# Altium schematic symbol library altera.SCHLIB: 68 symbols (part 5 of 6) (continued)
## EPM7096-J84
designator IC?, comment EPM7096   MAX 7000 family
MPN: EPM7096LC84-10; OC_FARNELL: unknown; OC_NEWARK: 51R9659
footprint PLCC84
part A pins: 1 GCLR/, 2 OE2-GCLK2, 4 IO16, 5 IO14, 8 IO12, 9 IO11, 10 IO9, 11 IO8, 12 IO6, 14 IO4, 15 IO3, 16 IO1, 17 IO32, 18 IO29, 20 IO28, 21 IO27, 22 IO25, 23 IO24, 24 IO22, 25 IO21, 27 IO19, 28 IO17, 29 IO48, 30 IO46, 31 IO45, 33 IO43, 34 IO41, 35 IO40, 36 IO38, 37 IO37, 40 IO35, 41 IO33, 44 IO49, 45 IO51, 48 IO53, 49 IO54, 50 IO56, 51 IO57, 52 IO59, 54 IO61, 55 IO62, 56 IO64, 57 IO65, 58 IO67, 60 IO69, 61 IO70, 62 IO72, 63 IO73, 64 IO75, 65 IO76, 67 IO77, 68 IO80, 69 IO81, 70 IO83, 71 IO84, 73 IO86, 74 IO88, 75 IO89, 76 IO91, 77 IO92, 80 IO94, 81 IO96, 83 GCLK1, 84 OE1
part B pins: 3 VCC (power), 7 GND (power), 13 VCCIO (power), 19 GND@1 (power), 26 VCCIO@1 (power), 32 GND@2 (power), 38 VCCIO@2 (power), 42 GND@3 (power), 43 VCC@1 (power), 47 GND@4 (power), 53 VCCIO@3 (power), 59 GND@5 (power), 66 VCCIO@4 (power), 72 GND@6 (power), 78 VCCIO@5 (power), 82 GND@7 (power)
part C pins: 6 NC
part D pins: 39 NC
part E pins: 46 NC
part F pins: 79 NC

## EPM7096-P100
designator IC?, comment EPM7096   MAX 7000 family
MPN: EPM7096QC100-10; OC_FARNELL: unknown; OC_NEWARK: 51R9665
footprint PQFP100
part A pins: 5 VCCIO (power), 13 GND (power), 20 VCCIO@1 (power), 28 GND@1 (power), 36 VCCIO@2 (power), 40 GND@2 (power), 41 VCC (power), 45 GND@3 (power), 53 VCCIO@3 (power), 61 GND@4 (power), 68 VCCIO@4 (power), 76 GND@5 (power), 84 VCCIO@5 (power), 88 GND@6 (power), 93 VCC@1 (power), 97 GND@7 (power)
part B pins: 9 NC
part C pins: 24 NC
part D pins: 37 NC
part E pins: 44 NC
part F pins: 57 NC
part G pins: 72 NC
part H pins: 85 NC
part I pins: 96 NC
part J pins: 1 IO9, 2 IO8, 3 IO6, 4 IO5, 6 IO4, 7 IO3, 8 IO1, 10 IO32, 11 IO30, 12 IO29, 14 IO28, 15 IO27, 16 IO25, 17 IO24, 18 IO22, 19 IO21, 21 IO20, 22 IO19, 23 IO17, 25 IO48, 26 IO46, 27 IO45, 29 IO44, 30 IO43, 31 IO41, 32 IO40, 33 IO38, 34 IO37, 35 IO36, 38 IO35, 39 IO33, 42 IO49, 43 IO51, 46 IO52, 47 IO53, 48 IO54, 49 IO56, 50 IO57, 51 IO59, 52 IO60, 54 IO61, 55 IO62, 56 IO64, 58 IO65, 59 IO67, 60 IO68, 62 IO69, 63 IO70, 64 IO72, 65 IO73, 66 IO75, 67 IO76, 69 IO77, 70 IO78, 71 IO80, 73 IO81, 74 IO83, 75 IO84, 77 IO85, 78 IO86, 79 IO88, 80 IO89, 81 IO91, 82 IO92, 83 IO93, 86 IO94, 87 IO96, 89 GCLK1, 90 OE1, 91 GCLR/, 92 OE2-GCLK2, 94 IO16, 95 IO14, 98 IO13, 99 IO12, 100 IO11

## EPM7128-?100P
designator IC?, comment EPM70128   MAX 7000 family
MPN: EPM7128SQC100-7N; OC_FARNELL: 1549424; OC_NEWARK: 51R0530
footprint PQFP100
part A pins: 1 IO6, 2 IO5, 3 IO3, 4 IO1, 6 IO32/TDI, 7 IO30, 8 IO29, 9 IO27, 10 IO25, 11 IO24, 12 IO22, 14 IO21, 15 IO19, 16 IO17, 17 IO48/TMS, 18 IO46, 19 IO45, 21 IO43, 22 IO41, 23 IO40, 24 IO38, 25 IO37, 26 IO35, 27 IO33, 29 IO64, 30 IO62, 31 IO61, 32 IO59, 33 IO57, 34 IO56, 35 IO54, 37 IO53, 38 IO51, 39 IO49, 42 IO65, 43 IO67, 44 IO69, 46 IO70, 47 IO72, 48 IO73, 49 IO75, 50 IO77, 51 IO78, 52 IO80, 54 IO81, 55 IO83, 56 IO85, 57 IO86, 58 IO88, 59 IO89, 60 IO91, 62 IO93, 63 IO94, 64 TCM/IO96, 65 IO97, 66 IO99, 67 IO101, 69 IO102, 70 IO104, 71 IO105, 72 IO107, 73 IO109, 74 IO110, 75 TDO/IO112, 77 IO113, 78 IO115, 79 IO117, 80 IO118, 81 IO120, 82 IO121, 83 IO123, 85 IO125, 86 IO126, 87 IO128, 89 GCLK1, 90 OE1, 91 GCLR/, 92 OE2-GCLK2, 94 IO16, 95 IO14, 96 IO13, 98 IO11, 99 IO9, 100 IO8
part B pins: 41 VCC (power)
part C pins: 93 VCC (power)
part D pins: 5 VCCIO (power)
part E pins: 20 VCCIO (power)
part F pins: 36 VCCIO (power)
part G pins: 53 VCCIO (power)
part H pins: 68 VCCIO (power)
part I pins: 84 VCCIO (power)
part J pins: 13 GND (power)
part K pins: 28 GND (power)
part L pins: 45 GND (power)
part M pins: 61 GND (power)
part N pins: 76 GND (power)
part O pins: 97 GND (power)
part P pins: 40 GND (power)
part Q pins: 88 GND (power)

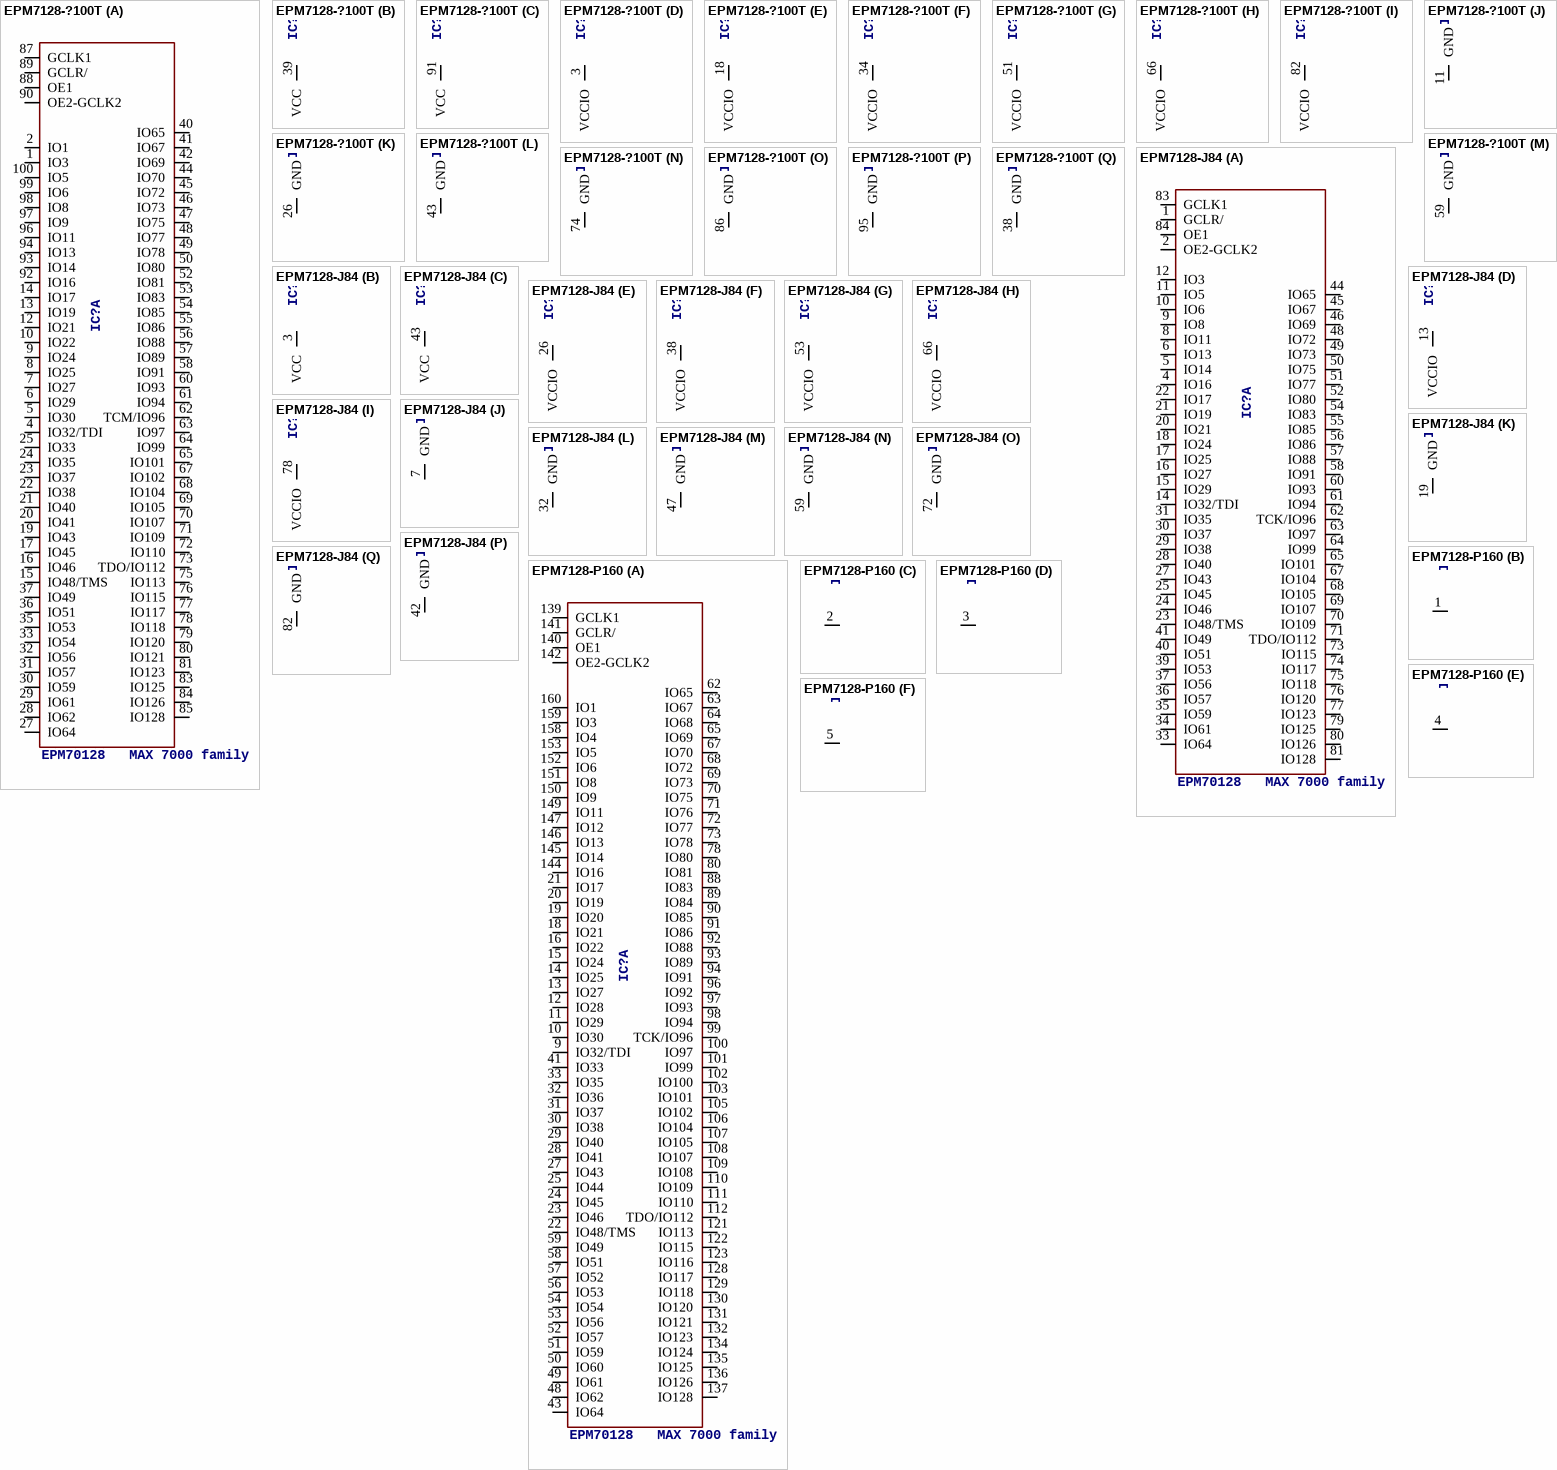
[diagram p43: symbols EPM7128-?100T to EPM7128-P160]

## EPM7128-?100T
designator IC?, comment EPM70128   MAX 7000 family
MPN: EPM7128STC100-7N; OC_FARNELL: 1549427; OC_NEWARK: 51R9778
footprint TQFP100
part A pins: 1 IO3, 2 IO1, 4 IO32/TDI, 5 IO30, 6 IO29, 7 IO27, 8 IO25, 9 IO24, 10 IO22, 12 IO21, 13 IO19, 14 IO17, 15 IO48/TMS, 16 IO46, 17 IO45, 19 IO43, 20 IO41, 21 IO40, 22 IO38, 23 IO37, 24 IO35, 25 IO33, 27 IO64, 28 IO62, 29 IO61, 30 IO59, 31 IO57, 32 IO56, 33 IO54, 35 IO53, 36 IO51, 37 IO49, 40 IO65, 41 IO67, 42 IO69, 44 IO70, 45 IO72, 46 IO73, 47 IO75, 48 IO77, 49 IO78, 50 IO80, 52 IO81, 53 IO83, 54 IO85, 55 IO86, 56 IO88, 57 IO89, 58 IO91, 60 IO93, 61 IO94, 62 TCM/IO96, 63 IO97, 64 IO99, 65 IO101, 67 IO102, 68 IO104, 69 IO105, 70 IO107, 71 IO109, 72 IO110, 73 TDO/IO112, 75 IO113, 76 IO115, 77 IO117, 78 IO118, 79 IO120, 80 IO121, 81 IO123, 83 IO125, 84 IO126, 85 IO128, 87 GCLK1, 88 OE1, 89 GCLR/, 90 OE2-GCLK2, 92 IO16, 93 IO14, 94 IO13, 96 IO11, 97 IO9, 98 IO8, 99 IO6, 100 IO5
part B pins: 39 VCC (power)
part C pins: 91 VCC (power)
part D pins: 3 VCCIO (power)
part E pins: 18 VCCIO (power)
part F pins: 34 VCCIO (power)
part G pins: 51 VCCIO (power)
part H pins: 66 VCCIO (power)
part I pins: 82 VCCIO (power)
part J pins: 11 GND (power)
part K pins: 26 GND (power)
part L pins: 43 GND (power)
part M pins: 59 GND (power)
part N pins: 74 GND (power)
part O pins: 86 GND (power)
part P pins: 95 GND (power)
part Q pins: 38 GND (power)

## EPM7128-J84
designator IC?, comment EPM70128   MAX 7000 family
MPN: EPM7128SLC84-7N; OC_FARNELL: 1549458; OC_NEWARK: 51R9744
footprint PLCC84
part A pins: 1 GCLR/, 2 OE2-GCLK2, 4 IO16, 5 IO14, 6 IO13, 8 IO11, 9 IO8, 10 IO6, 11 IO5, 12 IO3, 14 IO32/TDI, 15 IO29, 16 IO27, 17 IO25, 18 IO24, 20 IO21, 21 IO19, 22 IO17, 23 IO48/TMS, 24 IO46, 25 IO45, 27 IO43, 28 IO40, 29 IO38, 30 IO37, 31 IO35, 33 IO64, 34 IO61, 35 IO59, 36 IO57, 37 IO56, 39 IO53, 40 IO51, 41 IO49, 44 IO65, 45 IO67, 46 IO69, 48 IO72, 49 IO73, 50 IO75, 51 IO77, 52 IO80, 54 IO83, 55 IO85, 56 IO86, 57 IO88, 58 IO91, 60 IO93, 61 IO94, 62 TCK/IO96, 63 IO97, 64 IO99, 65 IO101, 67 IO104, 68 IO105, 69 IO107, 70 IO109, 71 TDO/IO112, 73 IO115, 74 IO117, 75 IO118, 76 IO120, 77 IO123, 79 IO125, 80 IO126, 81 IO128, 83 GCLK1, 84 OE1
part B pins: 3 VCC (power)
part C pins: 43 VCC (power)
part D pins: 13 VCCIO (power)
part E pins: 26 VCCIO (power)
part F pins: 38 VCCIO (power)
part G pins: 53 VCCIO (power)
part H pins: 66 VCCIO (power)
part I pins: 78 VCCIO (power)
part J pins: 7 GND (power)
part K pins: 19 GND (power)
part L pins: 32 GND (power)
part M pins: 47 GND (power)
part N pins: 59 GND (power)
part O pins: 72 GND (power)
part P pins: 42 GND (power)
part Q pins: 82 GND (power)

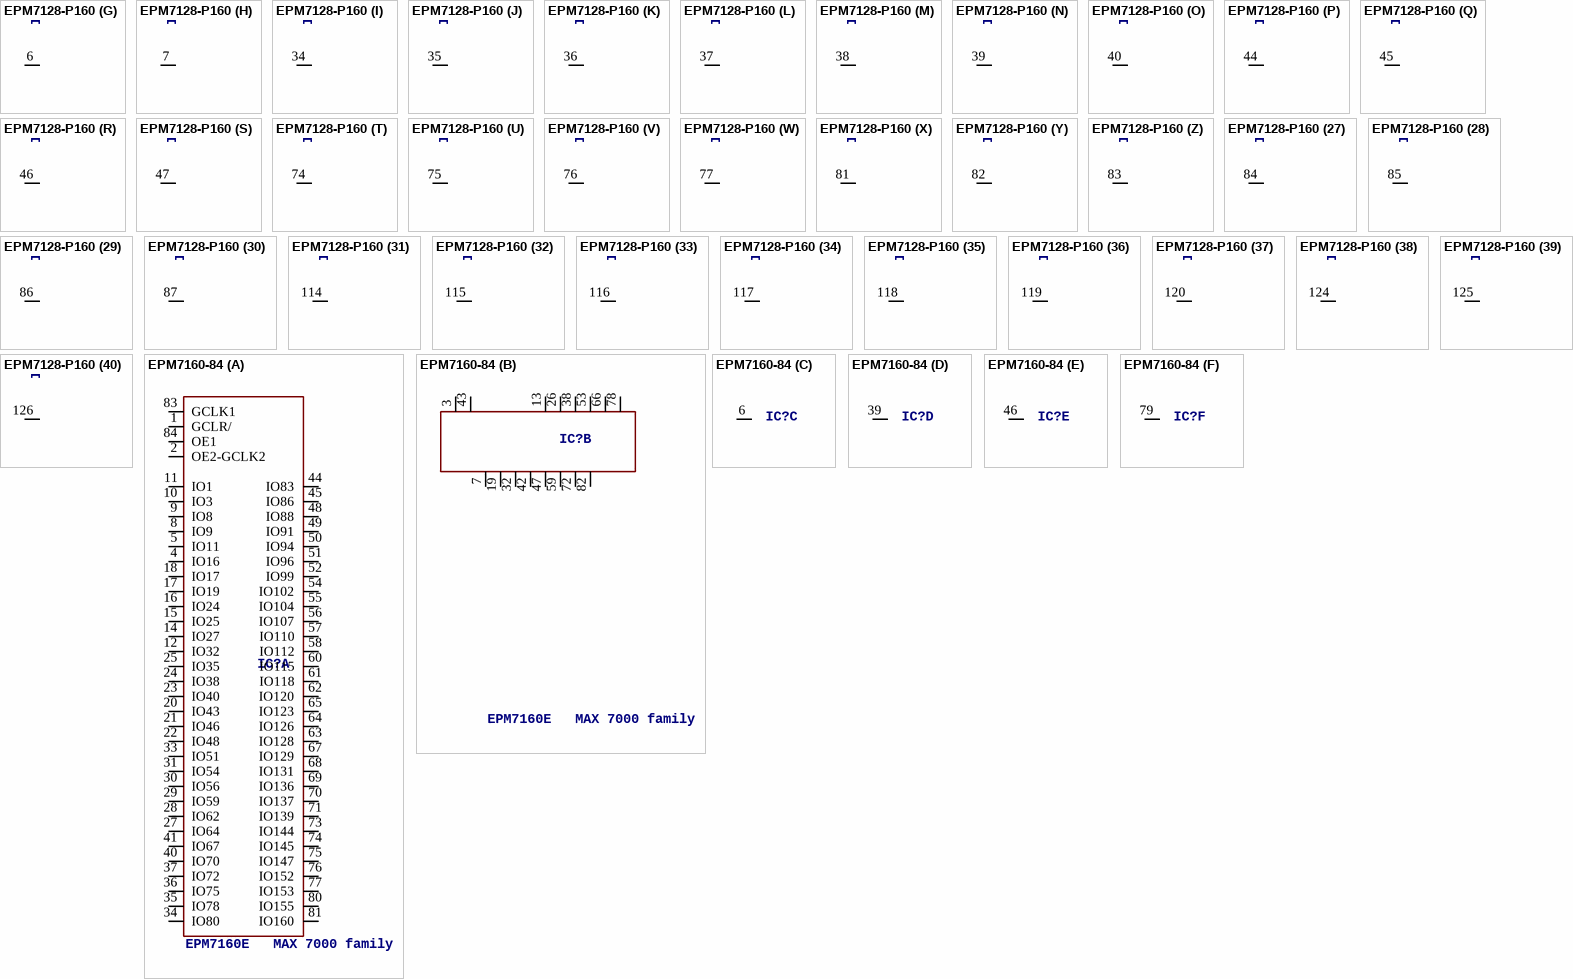
[diagram p44: symbols EPM7128-P160 to EPM7160-84]

## EPM7128-P160
designator IC?, comment EPM70128   MAX 7000 family
MPN: EPM7128SQC160-10N; OC_FARNELL: 1549435; OC_NEWARK: 51R9760
footprint PQFP160
part A pins: 9 IO32/TDI, 10 IO30, 11 IO29, 12 IO28, 13 IO27, 14 IO25, 15 IO24, 16 IO22, 18 IO21, 19 IO20, 20 IO19, 21 IO17, 22 IO48/TMS, 23 IO46, 24 IO45, 25 IO44, 27 IO43, 28 IO41, 29 IO40, 30 IO38, 31 IO37, 32 IO36, 33 IO35, 41 IO33, 43 IO64, 48 IO62, 49 IO61, 50 IO60, 51 IO59, 52 IO57, 53 IO56, 54 IO54, 56 IO53, 57 IO52, 58 IO51, 59 IO49, 62 IO65, 63 IO67, 64 IO68, 65 IO69, 67 IO70, 68 IO72, 69 IO73, 70 IO75, 71 IO76, 72 IO77, 73 IO78, 78 IO80, 80 IO81, 88 IO83, 89 IO84, 90 IO85, 91 IO86, 92 IO88, 93 IO89, 94 IO91, 96 IO92, 97 IO93, 98 IO94, 99 TCK/IO96, 100 IO97, 101 IO99, 102 IO100, 103 IO101, 105 IO102, 106 IO104, 107 IO105, 108 IO107, 109 IO108, 110 IO109, 111 IO110, 112 TDO/IO112, 121 IO113, 122 IO115, 123 IO116, 128 IO117, 129 IO118, 130 IO120, 131 IO121, 132 IO123, 134 IO124, 135 IO125, 136 IO126, 137 IO128, 139 GCLK1, 140 OE1, 141 GCLR/, 142 OE2-GCLK2, 144 IO16, 145 IO14, 146 IO13, 147 IO12, 149 IO11, 150 IO9, 151 IO8, 152 IO6, 153 IO5, 158 IO4, 159 IO3, 160 IO1
part B pins: 1 NC
part C pins: 2 NC
part D pins: 3 NC
part E pins: 4 NC
part F pins: 5 NC
part G pins: 6 NC
part H pins: 7 NC
part I pins: 34 NC
part J pins: 35 NC
part K pins: 36 NC
part L pins: 37 NC
part M pins: 38 NC
part N pins: 39 NC
part O pins: 40 NC
part P pins: 44 NC
part Q pins: 45 NC
part R pins: 46 NC
part S pins: 47 NC
part T pins: 74 NC
part U pins: 75 NC
part V pins: 76 NC
part W pins: 77 NC
part X pins: 81 NC
part Y pins: 82 NC
part Z pins: 83 NC
part 27 pins: 84 NC
part 28 pins: 85 NC
part 29 pins: 86 NC
part 30 pins: 87 NC
part 31 pins: 114 NC
part 32 pins: 115 NC
part 33 pins: 116 NC
part 34 pins: 117 NC
part 35 pins: 118 NC
part 36 pins: 119 NC
part 37 pins: 120 NC
part 38 pins: 124 NC
part 39 pins: 125 NC
part 40 pins: 126 NC
part 41 pins: 127 NC
part 42 pins: 154 NC
part 43 pins: 155 NC
part 44 pins: 156 NC
part 45 pins: 157 NC
part 46 pins: 61 VCC (power)
part 47 pins: 143 VCC (power)
part 48 pins: 8 VCCIO (power)
part 49 pins: 26 VCCIO (power)
part 50 pins: 55 VCCIO (power)
part 51 pins: 79 VCCIO (power)
part 52 pins: 104 VCCIO (power)
part 53 pins: 133 VCCIO (power)
part 54 pins: 17 GND (power)
part 55 pins: 42 GND (power)
part 56 pins: 60 GND (power)
part 57 pins: 66 GND (power)
part 58 pins: 95 GND (power)
part 59 pins: 113 GND (power)
part 60 pins: 148 GND (power)
part 61 pins: 138 GND (power)

## EPM7160-84
designator IC?, comment EPM7160E   MAX 7000 family
MPN: EPM7160SLC84-10N; OC_FARNELL: 1549460; OC_NEWARK: 51R0533
footprint PLCC84
part A pins: 1 GCLR/, 2 OE2-GCLK2, 4 IO16, 5 IO11, 8 IO9, 9 IO8, 10 IO3, 11 IO1, 12 IO32, 14 IO27, 15 IO25, 16 IO24, 17 IO19, 18 IO17, 20 IO43, 21 IO46, 22 IO48, 23 IO40, 24 IO38, 25 IO35, 27 IO64, 28 IO62, 29 IO59, 30 IO56, 31 IO54, 33 IO51, 34 IO80, 35 IO78, 36 IO75, 37 IO72, 40 IO70, 41 IO67, 44 IO83, 45 IO86, 48 IO88, 49 IO91, 50 IO94, 51 IO96, 52 IO99, 54 IO102, 55 IO104, 56 IO107, 57 IO110, 58 IO112, 60 IO115, 61 IO118, 62 IO120, 63 IO128, 64 IO126, 65 IO123, 67 IO129, 68 IO131, 69 IO136, 70 IO137, 71 IO139, 73 IO144, 74 IO145, 75 IO147, 76 IO152, 77 IO153, 80 IO155, 81 IO160, 83 GCLK1, 84 OE1
part B pins: 3 VCC (power), 7 GND (power), 13 VCCIO (power), 19 GND@1 (power), 26 VCCIO@1 (power), 32 GND@2 (power), 38 VCCIO@2 (power), 42 GND@3 (power), 43 VCC@1 (power), 47 GND@4 (power), 53 VCCIO@3 (power), 59 GND@5 (power), 66 VCCIO@4 (power), 72 GND@6 (power), 78 VCCIO@5 (power), 82 GND@7 (power)
part C pins: 6 NC
part D pins: 39 NC
part E pins: 46 NC
part F pins: 79 NC

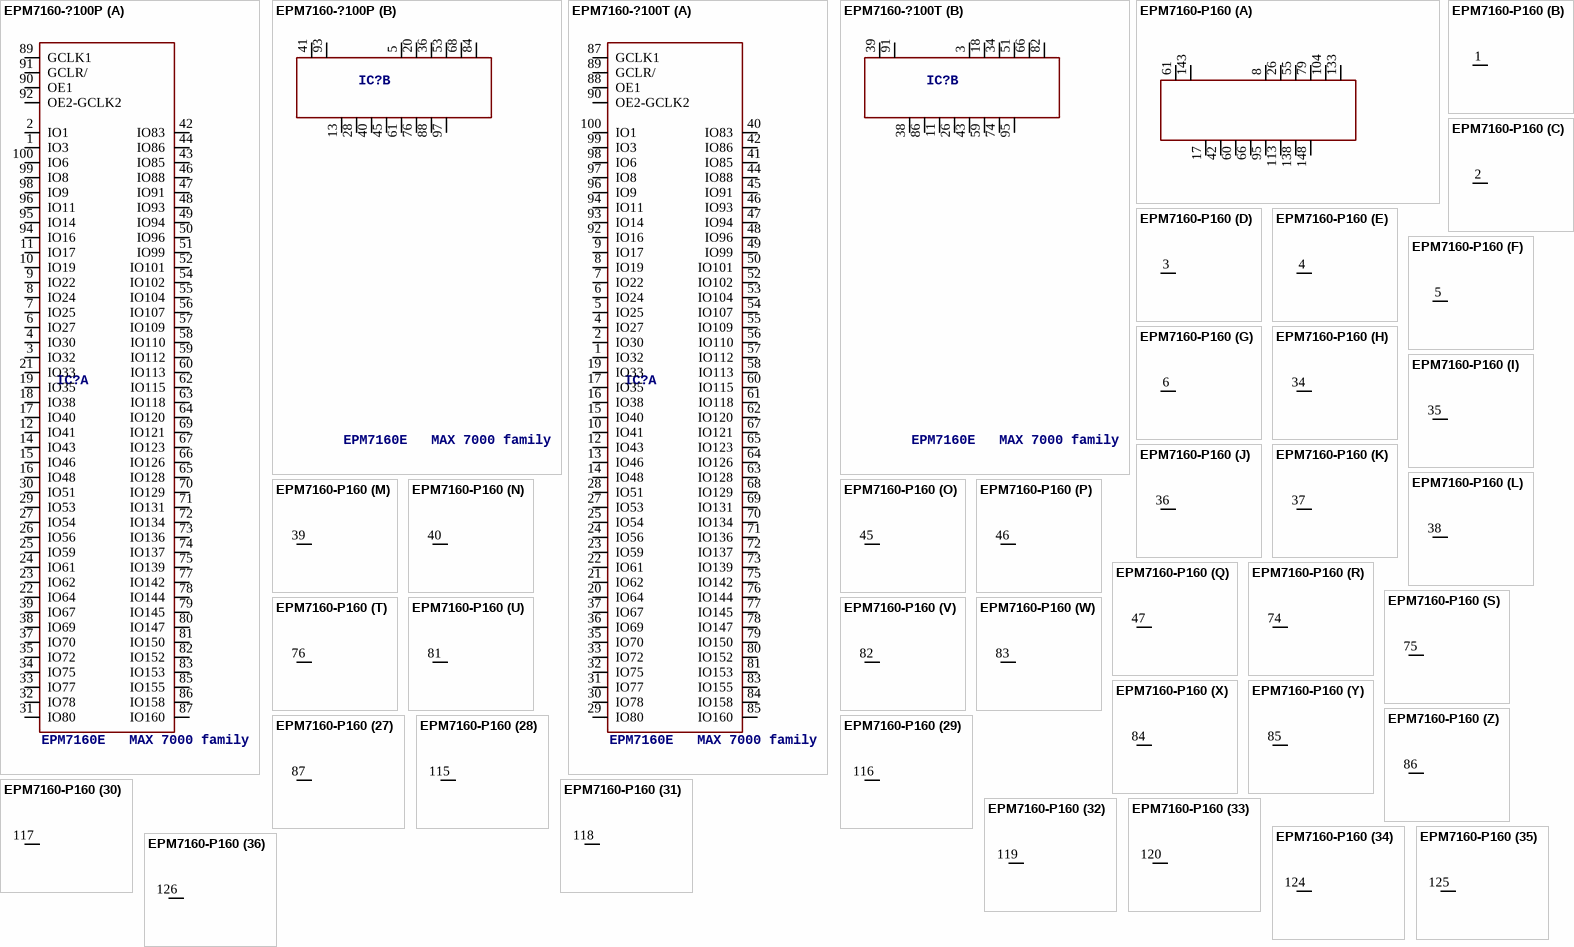
[diagram p45: symbols EPM7160-?100P to EPM7160-P160]

## EPM7160-?100P
designator IC?, comment EPM7160E   MAX 7000 family
MPN: EPM7160SQC160-10N; OC_FARNELL: 1549437; OC_NEWARK: 51R9800
footprint PQFP100
part A pins: 1 IO3, 2 IO1, 3 IO32, 4 IO30, 6 IO27, 7 IO25, 8 IO24, 9 IO22, 10 IO19, 11 IO17, 12 IO41, 14 IO43, 15 IO46, 16 IO48, 17 IO40, 18 IO38, 19 IO35, 21 IO33, 22 IO64, 23 IO62, 24 IO61, 25 IO59, 26 IO56, 27 IO54, 29 IO53, 30 IO51, 31 IO80, 32 IO78, 33 IO77, 34 IO75, 35 IO72, 37 IO70, 38 IO69, 39 IO67, 42 IO83, 43 IO85, 44 IO86, 46 IO88, 47 IO91, 48 IO93, 49 IO94, 50 IO96, 51 IO99, 52 IO101, 54 IO102, 55 IO104, 56 IO107, 57 IO109, 58 IO110, 59 IO112, 60 IO113, 62 IO115, 63 IO118, 64 IO120, 65 IO128, 66 IO126, 67 IO123, 69 IO121, 70 IO129, 71 IO131, 72 IO134, 73 IO136, 74 IO137, 75 IO139, 77 IO142, 78 IO144, 79 IO145, 80 IO147, 81 IO150, 82 IO152, 83 IO153, 85 IO155, 86 IO158, 87 IO160, 89 GCLK1, 90 OE1, 91 GCLR/, 92 OE2-GCLK2, 94 IO16, 95 IO14, 96 IO11, 98 IO9, 99 IO8, 100 IO6
part B pins: 5 VCCIO (power), 13 GND (power), 20 VCCIO@1 (power), 28 GND@1 (power), 36 VCCIO@2 (power), 40 GND@2 (power), 41 VCC (power), 45 GND@3 (power), 53 VCCIO@3 (power), 61 GND@4 (power), 68 VCCIO@4 (power), 76 GND@5 (power), 84 VCCIO@5 (power), 88 GND@6 (power), 93 VCC@1 (power), 97 GND@7 (power)

## EPM7160-?100T
designator IC?, comment EPM7160E   MAX 7000 family
MPN: EPM7160STC100-10N; OC_FARNELL: 1549429; OC_NEWARK: 51R9804
footprint TQFP100
part A pins: 1 IO32, 2 IO30, 4 IO27, 5 IO25, 6 IO24, 7 IO22, 8 IO19, 9 IO17, 10 IO41, 12 IO43, 13 IO46, 14 IO48, 15 IO40, 16 IO38, 17 IO35, 19 IO33, 20 IO64, 21 IO62, 22 IO61, 23 IO59, 24 IO56, 25 IO54, 27 IO53, 28 IO51, 29 IO80, 30 IO78, 31 IO77, 32 IO75, 33 IO72, 35 IO70, 36 IO69, 37 IO67, 40 IO83, 41 IO85, 42 IO86, 44 IO88, 45 IO91, 46 IO93, 47 IO94, 48 IO96, 49 IO99, 50 IO101, 52 IO102, 53 IO104, 54 IO107, 55 IO109, 56 IO110, 57 IO112, 58 IO113, 60 IO115, 61 IO118, 62 IO120, 63 IO128, 64 IO126, 65 IO123, 67 IO121, 68 IO129, 69 IO131, 70 IO134, 71 IO136, 72 IO137, 73 IO139, 75 IO142, 76 IO144, 77 IO145, 78 IO147, 79 IO150, 80 IO152, 81 IO153, 83 IO155, 84 IO158, 85 IO160, 87 GCLK1, 88 OE1, 89 GCLR/, 90 OE2-GCLK2, 92 IO16, 93 IO14, 94 IO11, 96 IO9, 97 IO8, 98 IO6, 99 IO3, 100 IO1
part B pins: 3 VCCIO (power), 11 GND@2 (power), 18 VCCIO@1 (power), 26 GND@3 (power), 34 VCCIO@2 (power), 38 GND (power), 39 VCC (power), 43 GND@4 (power), 51 VCCIO@3 (power), 59 GND@5 (power), 66 VCCIO@4 (power), 74 GND@6 (power), 82 VCCIO@5 (power), 86 GND@1 (power), 91 VCC@1 (power), 95 GND@7 (power)

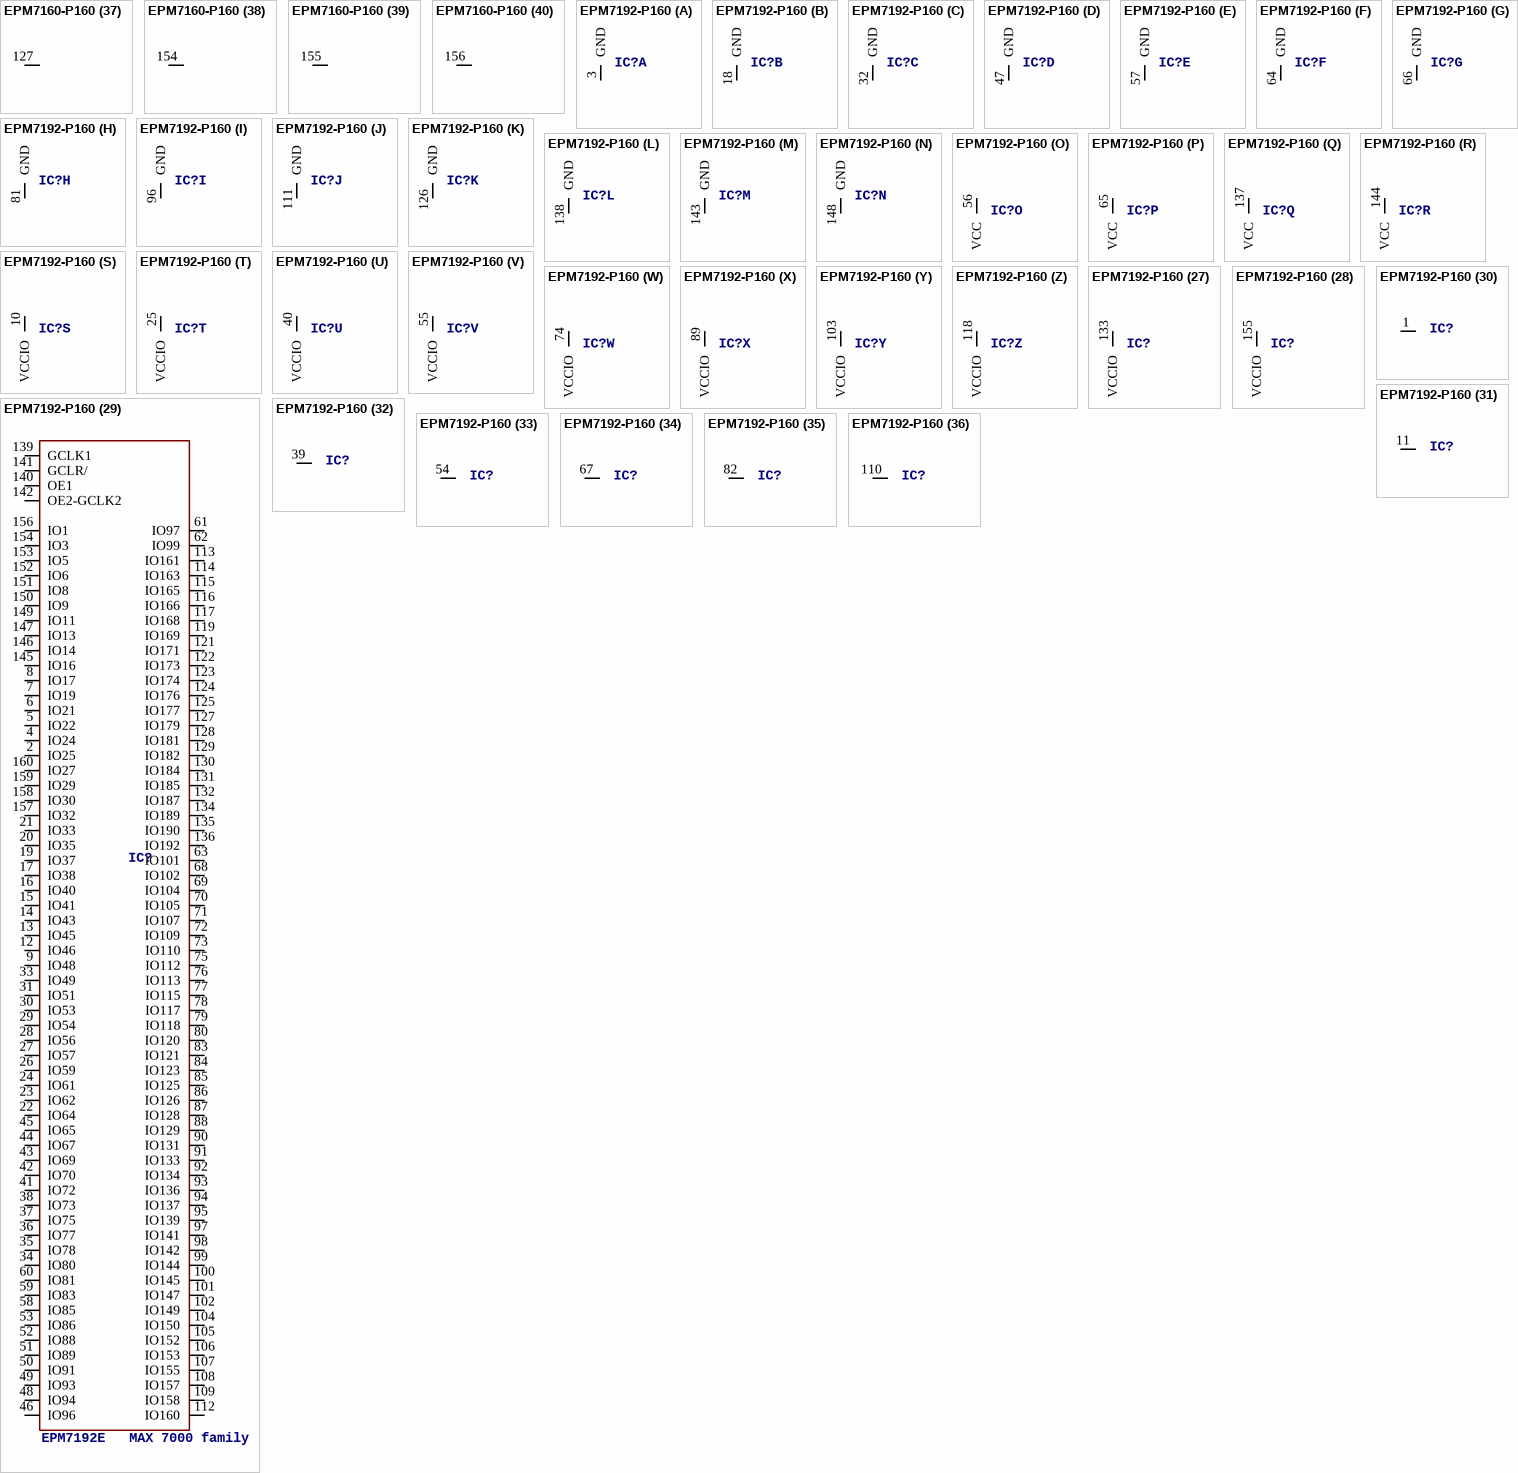
[diagram p46: symbols EPM7160-P160 to EPM7192-P160]

## EPM7160-P160
designator IC?, comment EPM7160S   MAX 7000 family
MPN: EPM7160SQC160-10N; OC_FARNELL: 1549437; OC_NEWARK: 51R9800
footprint PQFP160
part A pins: 8 VCCIO (power), 17 GND (power), 26 VCCIO@1 (power), 42 GND@1 (power), 55 VCCIO@2 (power), 60 GND@2 (power), 61 VCC (power), 66 GND@3 (power), 79 VCCIO@3 (power), 95 GND@4 (power), 104 VCCIO@4 (power), 113 GND@5 (power), 133 VCCIO@5 (power), 138 GND@6 (power), 143 VCC@1 (power), 148 GND@7 (power)
part B pins: 1 NC
part C pins: 2 NC
part D pins: 3 NC
part E pins: 4 NC
part F pins: 5 NC
part G pins: 6 NC
part H pins: 34 NC
part I pins: 35 NC
part J pins: 36 NC
part K pins: 37 NC
part L pins: 38 NC
part M pins: 39 NC
part N pins: 40 NC
part O pins: 45 NC
part P pins: 46 NC
part Q pins: 47 NC
part R pins: 74 NC
part S pins: 75 NC
part T pins: 76 NC
part U pins: 81 NC
part V pins: 82 NC
part W pins: 83 NC
part X pins: 84 NC
part Y pins: 85 NC
part Z pins: 86 NC
part 27 pins: 87 NC
part 28 pins: 115 NC
part 29 pins: 116 NC
part 30 pins: 117 NC
part 31 pins: 118 NC
part 32 pins: 119 NC
part 33 pins: 120 NC
part 34 pins: 124 NC
part 35 pins: 125 NC
part 36 pins: 126 NC
part 37 pins: 127 NC
part 38 pins: 154 NC
part 39 pins: 155 NC
part 40 pins: 156 NC
part 41 pins: 157 NC
part 42 pins: 7 IO29, 9 IO27, 10 IO25, 11 IO24, 12 IO22, 13 IO21, 14 IO19, 15 IO17, 16 IO41, 18 IO43, 19 IO45, 20 IO46, 21 IO48, 22 IO40, 23 IO38, 24 IO37, 25 IO35, 27 IO33, 28 IO64, 29 IO62, 30 IO61, 31 IO59, 32 IO57, 33 IO56, 41 IO54, 43 IO53, 44 IO51, 48 IO49, 49 IO80, 50 IO78, 51 IO77-TDI, 52 IO75, 53 IO73, 54 IO72, 56 IO70, 57 IO69, 58 IO67, 59 IO65, 62 IO81, 63 IO83, 64 IO85, 65 IO86, 67 IO88, 68 IO89, 69 IO91, 70 IO93, 71 IO94, 72 IO96, 73 IO97, 77 IO99, 78 IO101, 80 IO102, 88 IO104, 89 IO105, 90 IO107, 91 IO109-TMS, 92 IO110, 93 IO112, 94 IO113, 96 IO115, 97 IO117, 98 IO118, 99 IO120, 100 IO128, 101 IO126, 102 IO125, 103 IO123, 105 IO121, 106 IO129, 107 IO131, 108 IO133, 109 IO134, 110 IO136, 111 IO137, 112 IO139, 114 TDO-IO141, 121 IO142, 122 IO144, 123 IO145, 128 IO147, 129 IO149, 130 IO150, 131 IO152, 132 IO153, 134 IO155, 135 IO157, 136 IO158, 137 IO160, 139 GCLK1, 140 OE1, 141 GCLR/, 142 OE2-GCLK2, 144 IO16, 145 IO14, 146 IO13, 147 IO11, 149 IO9, 150 IO8, 151 IO6, 152 IO5, 153 IO3, 158 IO1, 159 IO32, 160 IO30

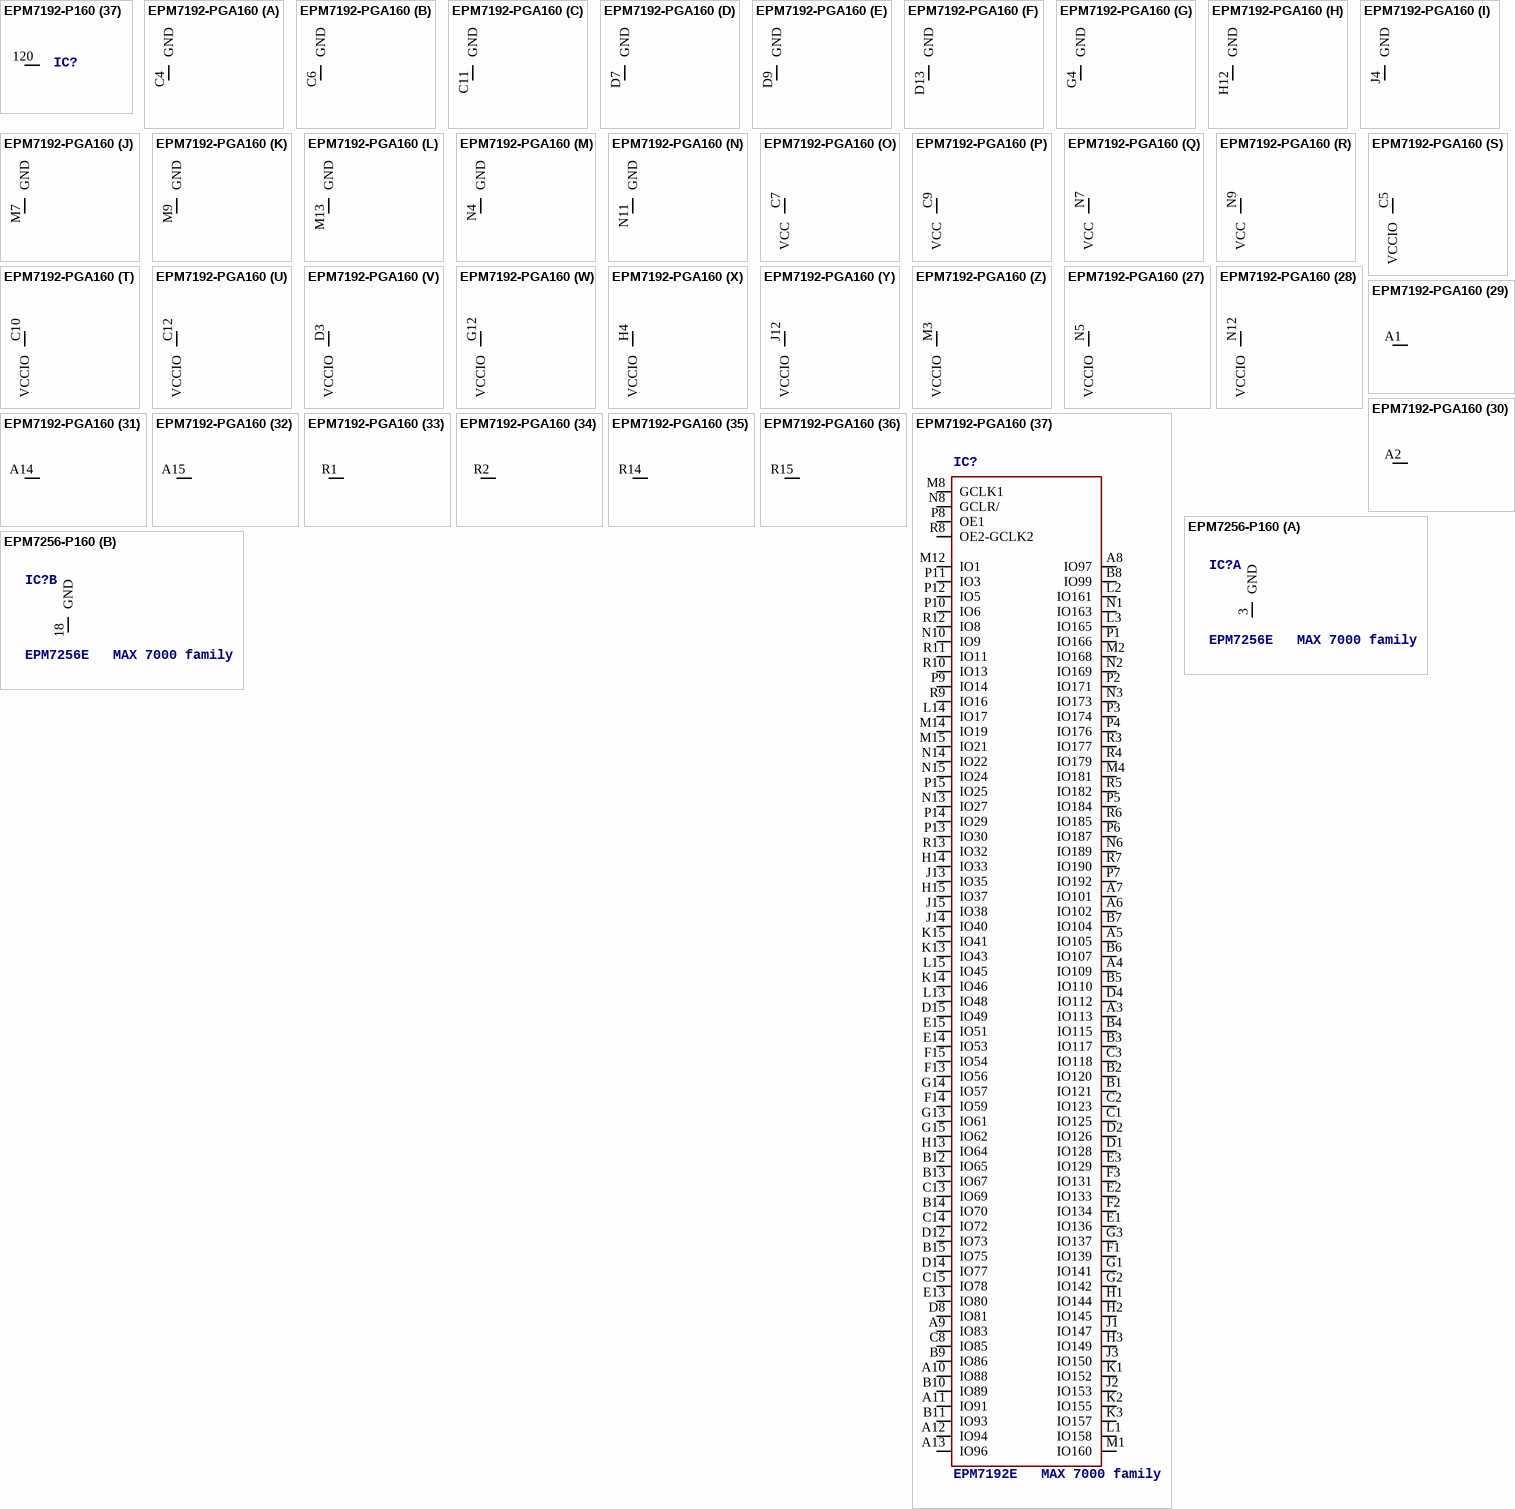
[diagram p47: symbols EPM7192-P160 to EPM7256-P160]